# Altium footprint library PassiveComponents.PcbLib: 48 footprints (part 2 of 3)
Each footprint in its own frame and in the unit in brackets; x right, y up, seen from the top. Pads: shape width x height; smd on the part's side, far side on the other; paste and mask are expansions set on the pad; w line width, h text height; cw(c..) or ccw(c..) is an arc to the next point about the centre after c.
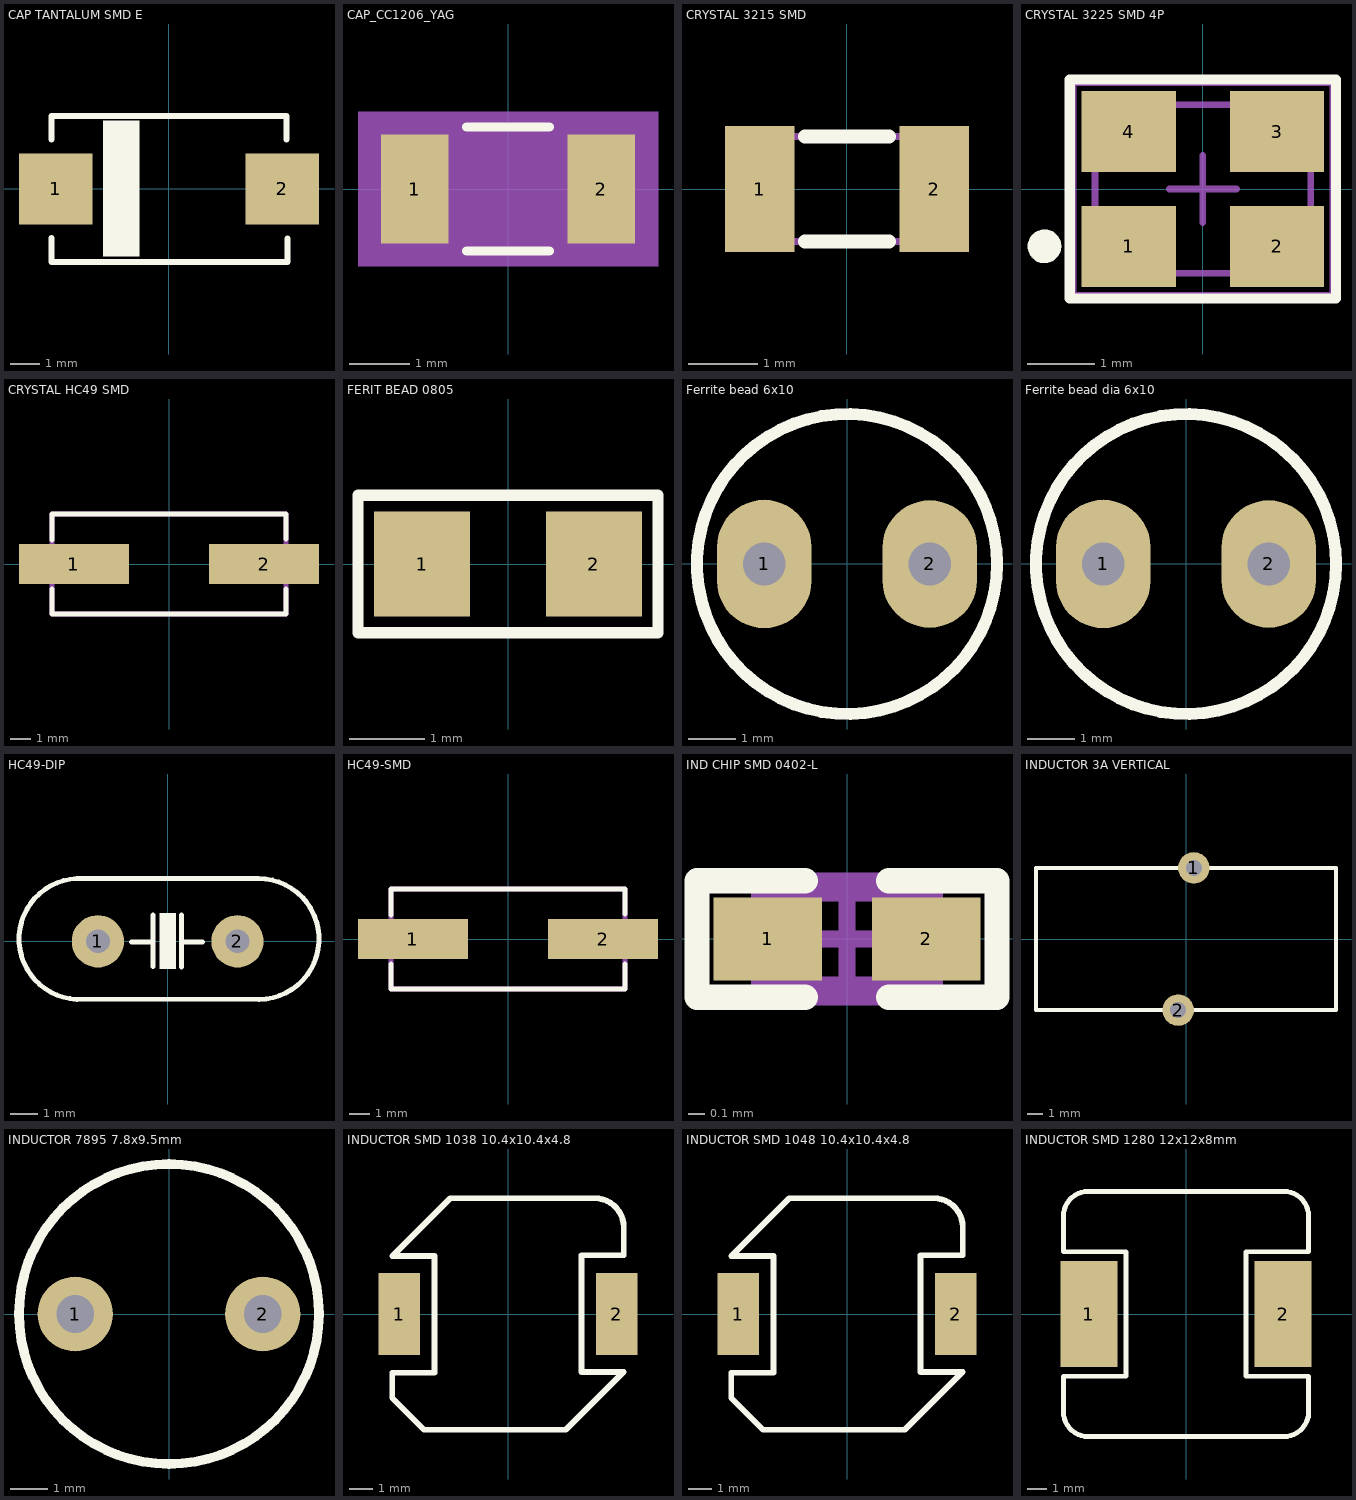
[diagram p1: the footprints below, top view; thin cyan lines are the x and y axes]

## CAP TANTALUM SMD E [mm]
pads (2):
  rect 2.5x2.4 smd: 1(-3.85,0) 2(3.85,0)
Top Overlay:
  rectangle: -2.25,-2.3 -1,2.325
  lines w0.203: -4,-2.487 4,-2.487 ; -4,-2.463 -4,-1.662 ; -4,1.687 -4,2.488 4,2.488 4,1.687 ; 4.025,-2.488 4.025,-1.687
3D body "User Library-CAP_TANT_7343-40.STEP": height 4, standoff 0, extent -3.8,-2.312 3.8,2.288

## CAP_CC1206_YAG [mil]
pads (2):
  rect 44x71 smd paste+0 mask+0: 1(-61,0) 2(61,0)
Top Overlay:
  lines w6: -26.89,-40.5 26.89,-40.5 ; -26.89,40.5 26.89,40.5
Mechanical 5:
  region: 98,-50.5 -98,-50.5 -98,50.5 98,50.5
Mechanical 13:
  lines w1: -69,-35.5 -69,35.5 ; -69,-35.5 -39,-35.5 -39,35.5 -69,35.5 ; -69,-35.5 69,-35.5 ; -69,-35.5 -69,35.5 ; -69,35.5 69,35.5 ; 69,-35.5 39,-35.5 39,35.5 69,35.5 ; 69,-35.5 69,35.5 ; 69,-35.5 69,35.5
Mechanical 15:
  region: 93,-45.5 -93,-45.5 -93,45.5 93,45.5
  lines w6: -93,-45.5 -93,45.5 93,45.5 93,-45.5 -93,-45.5
3D body "CAP_CC1206_YAG.step": height 70.98, standoff 0, extent -69.02,-35.51 69.02,35.51

## CRYSTAL 3215 SMD [mm] "XTAL SMD 3.2 x 1.5 mm"
height 0.8
pads (2):
  rect 1x1.8 smd: 1(-1.25,0) 2(1.25,0)
Top Overlay:
  lines w0.2: -0.6,-0.75 0.6,-0.75 ; -0.6,0.75 0.6,0.75
Mechanical 3:
  lines w0.1: -1.6,-0.55 cw(c-1.6,-0.75) -1.4,-0.75 1.4,-0.75 cw(c1.6,-0.75) 1.6,-0.55 1.6,0.55 cw(c1.6,0.75) 1.4,0.75 -1.4,0.75 cw(c-1.6,0.75) -1.6,0.55 -1.6,-0.55
3D body "User Library-Siward_SX3215.step": height 0.81, standoff 0, extent -1.6,-0.75 1.6,0.75
3D body: height 0.81, standoff 0.15, extent -1.2,-0.6 1.2,0.6

## CRYSTAL 3225 SMD 4P [mm] "SMD, 4-Leads, Body 3.2x2.5mm"
height 0.8
pads (4):
  rect 1.4x1.2 smd: 1(-1.1,-0.85) 2(1.1,-0.85) 3(1.1,0.85) 4(-1.1,0.85)
Top Overlay:
  circle w0.25: c-2.35,-0.85 r0.125
  lines w0.152: -1.975,-1.625 -1.975,1.625 1.975,1.625 1.975,-1.625 -1.975,-1.625
Mechanical 13:
  lines w0.1: -1.6,-1.25 1.6,-1.25 1.6,1.25 -1.6,1.25 -1.6,-1.25
Mechanical 15:
  lines w0.05: -1.9,-1.55 1.9,-1.55 1.9,1.55 -1.9,1.55 -1.9,-1.55
  lines w0.1: -0.5,0 0.5,0 ; 0,-0.5 0,0.5
3D body: height 0.8, standoff 0, extent -1.6,-1.25 1.6,1.25

## CRYSTAL HC49 SMD [mm]
pads (2):
  rect 5.5x2 smd: 1(-4.75,0) 2(4.75,0)
Top Overlay:
  lines w0.254: -5.85,-1.25 -5.85,-2.5 5.85,-2.5 5.85,-1.25 ; -5.85,1.206 -5.85,2.5 5.85,2.5 5.85,1.25
Mechanical 13:
  lines w0.254: -5.85,-2.5 5.85,-2.5 5.85,2.5 -5.85,2.5 -5.85,-2.5
3D body "User Library-HC49_SMD.step": height 4.3, standoff 0, extent -6.15,-2.25 6.15,2.25

## FERIT BEAD 0805 [mil]
pads (2):
  rect 50x55 smd: 1(-45,0) 2(45,0)
Top Overlay:
  lines w6: -78.5,-36 -78.5,36 78.5,36 78.5,-36 -78.5,-36
3D body "SW3dPS-smt_resistor_packages.STEP": height 24.02, standoff -0.39, extent -39.76,-24.99 39.76,25

## Ferrite bead 6x10 [mm]
pads (2):
  oval 2x2.72 hole 0.9: 1(-1.753,0)
  oval 2x2.7 hole 0.9: 2(1.753,0)
Top Overlay:
  circle w0.254: c0,0 r3.175
3D body "44111.stp": height 13.25, standoff -18, extent -4.242,-4.243 4.243,4.243

## Ferrite bead dia 6x10 [mm]
pads (2):
  oval 2x2.72 hole 0.9: 1(-1.753,0)
  oval 2x2.7 hole 0.9: 2(1.753,0)
Top Overlay:
  circle w0.254: c0,0 r3.175
3D body "44111.stp": height 13.25, standoff -18, extent -4.242,-4.243 4.243,4.243

## HC49-DIP [mil] "Footpin for Crystal 2 pin"
pads (2):
  round 75 hole 34: 1(-100,0) 2(100,0)
Top Overlay:
  region: 11.5,40 11.5,-39 -11.5,-39 -11.5,40
  lines w7: -135,-82.99 130,-82.99 ; -130,-83.09 cw(c-126.52,3.46) -130,90 130,90 cw(c130.27,3.39) 130.84,-83.23 ; -52,-1 -21,-1 ; -21,-36 -21,38 ; 20,-37 20,38 ; 20,-1 50,-1
3D body "User Library-HC49S-1.STEP": height 143.7, standoff -116.14, extent -216.14,-86.81 216.14,90

## HC49-SMD [mm]
pads (2):
  rect 5.5x2 smd: 1(-4.75,0) 2(4.75,0)
Top Overlay:
  lines w0.254: -5.85,-1.25 -5.85,-2.5 5.85,-2.5 5.85,-1.25 ; -5.85,1.206 -5.85,2.5 5.85,2.5 5.85,1.25
Mechanical 13:
  lines w0.254: -5.85,-2.5 -5.85,2.5 5.85,2.5 5.85,-2.5 -5.85,-2.5
3D body "User Library-HC49_SMD.step": height 4.3, standoff 0, extent -6.15,-2.25 6.15,2.25

## IND CHIP SMD 0402-L [mm] "Chip Inductor, 2-Leads, Body 1.0x0.5mm, IPC High Density"
height 0.4
pads (2):
  rect 0.65x0.5 smd: 1(-0.475,0) 2(0.475,0)
Top Overlay:
  lines w0.152: -0.25,-0.35 -0.9,-0.35 -0.9,0.35 -0.25,0.35 ; 0.25,-0.35 0.9,-0.35 0.9,0.35 0.25,0.35
Mechanical 13:
  lines w0.1: -0.525,-0.275 0.525,-0.275 0.525,0.275 -0.525,0.275 -0.525,-0.275
Mechanical 15:
  lines w0.1: -0.275,0 0.275,0 ; 0,-0.275 0,0.275 ; -0.9,-0.35 0.9,-0.35 0.9,0.35 -0.9,0.35 -0.9,-0.35
3D body "User Library-Chip Inductor 0402.step": height 0.5, standoff 0, extent -0.5,-0.3 0.5,0.3

## INDUCTOR 3A VERTICAL [mm]
pads (2):
  round 2 hole 1: 1(0.5,4.5) 2(-0.5,-4.5)
Top Overlay:
  lines w0.254: -9.5,-4.5 -9.5,4.5 9.5,4.5 9.5,-4.5 -9.5,-4.5
3D body "User Library-coilD17H9.STEP": height 18.35, standoff -2.9, extent -9.25,-5 9.25,5

## INDUCTOR 7895 7.8x9.5mm [mm] "Inductor Body D7.8xH9.5mm, Pitch 5mm, Pad 2mm, Drill 1mm"
pads (2):
  round 2 hole 1: 1(-2.5,0) 2(2.5,0)
Top Overlay:
  circle w0.254: c0,0 r4
3D body "User Library-RCH89NP-473K.STEP": height 9.7, standoff -4.8, extent -3.9,-3.9 3.9,3.9

## INDUCTOR SMD 1038 10.4x10.4x4.8 [mm] "Inductor 1038 Body 10.4x10.4x3.8mm, Pad 3.56x1.78mm"
height 3.8
pads (2):
  rect 1.78x3.56 smd: 1(-4.7,0) 2(4.7,0)
Top Overlay:
  lines w0.254: -5,-3.625 -5,-2.54 -3.175,-2.54 -3.175,2.5 -5,2.5 -2.5,5 3.75,5 cw(c3.75,3.75) 5,3.75 5,2.54 3.175,2.54 3.175,-2.5 5,-2.5 2.5,-5 -3.625,-5 -5,-3.625
3D body "Coilcraft-MSS1038-DEFAULT.STEP": height 3.9, standoff -0.1, extent -5.15,-5.1 5.15,5.1

## INDUCTOR SMD 1048 10.4x10.4x4.8 [mm] "Inductor 1038 Body 10.4x10.4x4.8mm, Pad 3.56x1.78mm"
height 4.8
pads (2):
  rect 1.78x3.56 smd: 1(-4.7,0) 2(4.7,0)
Top Overlay:
  lines w0.254: -5,-3.625 -3.625,-5 2.5,-5 5,-2.5 3.175,-2.5 3.175,2.54 5,2.54 5,3.75 ccw(c3.75,3.75) 3.75,5 -2.5,5 -5,2.5 -3.175,2.5 -3.175,-2.54 -5,-2.54 -5,-3.625
3D body "Coilcraft-MSS1048-DEFAULT.STEP": height 5, standoff -0.1, extent -5.15,-5.1 5.15,5.1

## INDUCTOR SMD 1280 12x12x8mm [mm] "Inductor 1280 Body 12x12x8mm, Pad 5.4x2.9mm"
height 8
pads (2):
  rect 2.9x5.4 smd: 1(-4.95,0) 2(4.95,0)
Top Overlay:
  lines w0.254: 6.25,-5.25 6.25,-3.175 3.048,-3.175 3.048,3.175 6.25,3.175 6.25,5 ccw(c5,5) 5,6.25 ; 6.25,-5 cw(c5,-5) 5,-6.25 -5,-6.25 ; -5,-6.25 cw(c-5,-5) -6.25,-5 -6.25,-3.175 -3.048,-3.175 -3.048,3.175 -6.25,3.175 -6.25,5 cw(c-5,5) -5,6.25 5,6.25 ; -5,-6.25 -5,-6.25 ; 5,6.25 5,6.25
3D body "User Library-WE-DD-L.STEP": height 6.7, standoff 0, extent -6.25,-6.25 6.25,6.25